# Altium footprint library ALL.PcbLib: 153 footprints (part 9 of 11)
Each footprint in its own frame and in the unit in brackets; x right, y up, seen from the top. Pads: shape width x height; smd on the part's side, far side on the other; paste and mask are expansions set on the pad; w line width, h text height; cw(c..) or ccw(c..) is an arc to the next point about the centre after c.
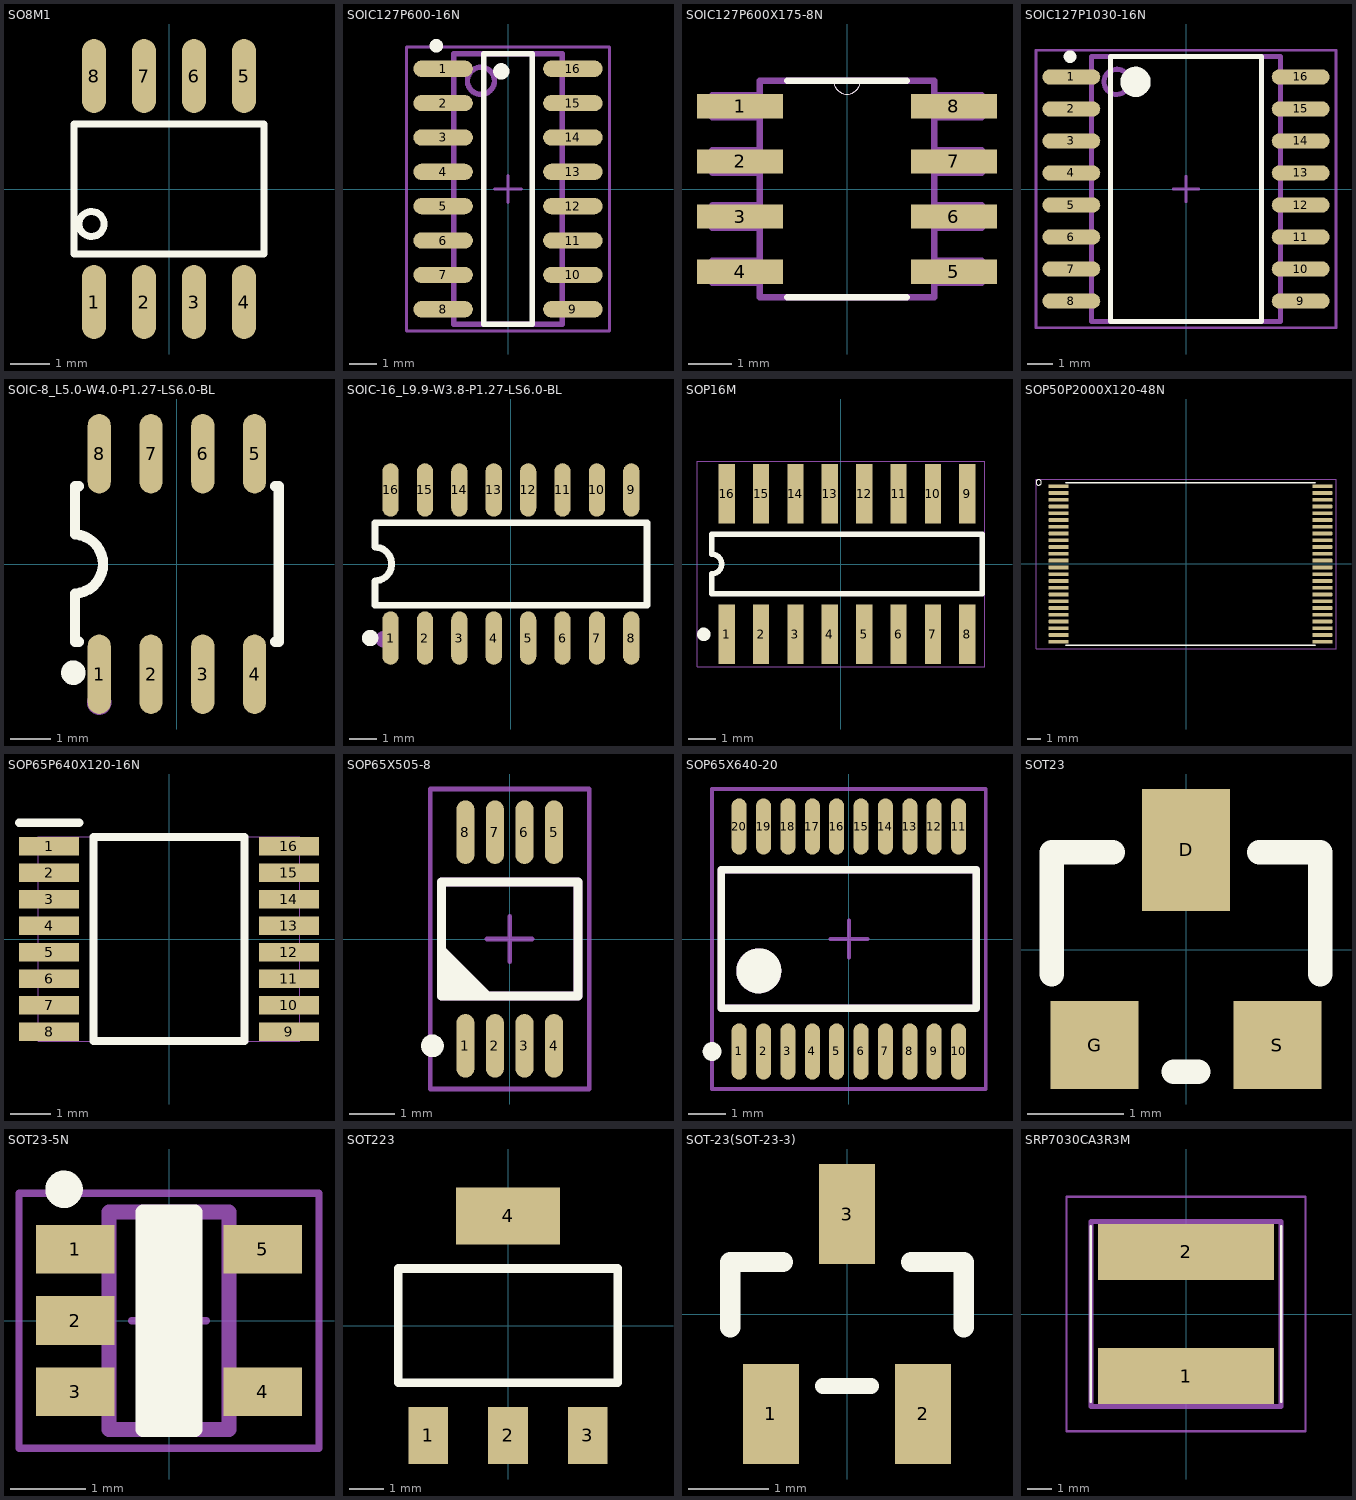
[diagram p8: the footprints below, top view; thin cyan lines are the x and y axes]

## SO8M1 [mil]
pads (8):
  oval 24x74 smd: 1(-75,-113) 2(-25,-113) 3(25,-113) 4(75,-113) 5(75,113) 6(25,113) 7(-25,113) 8(-75,113)
Top Overlay:
  circle w7: c-77.5,-35 r12.5
  lines w7: -95,-65 -95,65 95,65 95,-65 -95,-65

## SOIC127P600-16N [mm]
pads (16):
  oval 2.2x0.6 smd: 1(-2.4,4.445) 2(-2.4,3.175) 3(-2.4,1.905) 4(-2.4,0.635) 5(-2.4,-0.635) 6(-2.4,-1.905) 7(-2.4,-3.175) 8(-2.4,-4.445) 9(2.4,-4.445) 10(2.4,-3.175) 11(2.4,-1.905) 12(2.4,-0.635) 13(2.4,0.635) 14(2.4,1.905) 15(2.4,3.175) 16(2.4,4.445)
Top Overlay:
  circle w0.3: c-0.25,4.35 r0.15
  circle w0.25: c-2.65,5.295 r0.125
  lines w0.2: -0.9,-5 0.9,-5 0.9,5 -0.9,5 -0.9,-5
Mechanical 1:
  circle w0.2: c-1,4 r0.5
  lines w0.2: -2,-5 2,-5 2,5 -2,5 -2,-5
  text "U28" at 0.5,-1.45 h1
Mechanical 8:
  lines w0.1: -0.5,0 0.5,0 ; 0,-0.5 0,0.5 ; -3.75,-5.25 3.75,-5.25 3.75,5.25 -3.75,5.25 -3.75,-5.25
Mechanical 9:
  lines w0.001: -2,-5 2,-5 2,5 -2,5 -2,-5

## SOIC127P600X175-8N [mil]
pads (8):
  rect 78x22 smd: 1(-97,75) 2(-97,25) 3(-97,-25) 4(-97,-75) 5(97,-75) 6(97,-25) 7(97,25) 8(97,75)
Top Overlay:
  lines w0: -12,98 ccw(c0,98) 12,98
  lines w6: -54,-98 54,-98 ; -54,98 -12,98 12,98 54,98
Mechanical 13:
  lines w0: -12,98 ccw(c0,98) 12,98
  lines w6: -122,-85 -122,-65 -79,-65 -79,-85 -122,-85 ; -122,-35 -122,-15 -79,-15 -79,-35 -122,-35 ; -122,15 -122,35 -79,35 -79,15 -122,15 ; -122,65 -122,85 -79,85 -79,65 -122,65 ; -79,-98 79,-98 79,98 12,98 -12,98 -79,98 -79,-98 ; 79,-85 79,-65 122,-65 122,-85 79,-85 ; 79,-35 79,-15 122,-15 122,-35 79,-35 ; 79,15 79,35 122,35 122,15 79,15 ; 79,65 79,85 122,85 122,65 79,65
3D body "step_temp.STEP": height 68.9, standoff 0, extent -118.11,-96.46 118.11,96.46

## SOIC127P1030-16N [mm]
pads (16):
  oval 2.3x0.6 smd: 1(-4.55,4.445) 2(-4.55,3.175) 3(-4.55,1.905) 4(-4.55,0.635) 5(-4.55,-0.635) 6(-4.55,-1.905) 7(-4.55,-3.175) 8(-4.55,-4.445) 9(4.55,-4.445) 10(4.55,-3.175) 11(4.55,-1.905) 12(4.55,-0.635) 13(4.55,0.635) 14(4.55,1.905) 15(4.55,3.175) 16(4.55,4.445)
Top Overlay:
  circle w0.6: c-2,4.25 r0.3
  circle w0.25: c-4.6,5.25 r0.125
  lines w0.2: -3,-5.25 3,-5.25 3,5.25 -3,5.25 -3,-5.25
Mechanical 1:
  circle w0.2: c-2.75,4.25 r0.5
  lines w0.2: -3.75,-5.25 3.75,-5.25 3.75,5.25 -3.75,5.25 -3.75,-5.25
  text "U134" at -1.64,-0.5 h1
Mechanical 8:
  lines w0.1: -0.5,0 0.5,0 ; 0,-0.5 0,0.5 ; -5.95,-5.5 5.95,-5.5 5.95,5.5 -5.95,5.5 -5.95,-5.5
Mechanical 9:
  lines w0.001: -3.75,-5.25 3.75,-5.25 3.75,5.25 -3.75,5.25 -3.75,-5.25

## SOIC-8_L5.0-W4.0-P1.27-LS6.0-BL [mil]
pads (8):
  oval 22.38x76.78 smd: 1(-75,-106.5) 2(-25,-106.5) 3(25,-106.5) 4(75,-106.5) 5(75,106.5) 6(25,106.5) 7(-25,106.5) 8(-75,106.5)
Top Overlay:
  circle w11.81: c-100,-105 r5.91
  lines w10: -98.43,-28.61 ccw(c-99.99,0) -98.23,28.59 ; -98.42,-28.61 -98.42,-59.05 -98.42,-75 -94.83,-75 ; -98.42,28.59 -98.42,59.05 -98.42,75 -94.83,75 ; 94.83,-75 98.42,-75 98.42,-59.05 98.42,59.05 98.42,75 94.83,75
Mechanical 15:
  circle w11.81: c-75,-133.86 r5.91

## SOIC-16_L9.9-W3.8-P1.27-LS6.0-BL [mm]
pads (16):
  oval 0.602x1.971 smd: 1(-4.445,-2.736) 2(-3.175,-2.736) 3(-1.905,-2.736) 4(-0.635,-2.736) 5(0.635,-2.736) 6(1.905,-2.736) 7(3.175,-2.736) 8(4.445,-2.736) 9(4.445,2.736) 10(3.175,2.736) 11(1.905,2.736) 12(0.635,2.736) 13(-0.635,2.736) 14(-1.905,2.736) 15(-3.175,2.736) 16(-4.445,2.736)
Top Overlay:
  circle w0.3: c-5.198,-2.736 r0.15
  lines w0.254: -5.026,0.621 -5.026,1.521 5.026,1.521 5.026,-1.521 -5.026,-1.521 -5.026,-0.621 ccw(c-5.026,0.001) -5.026,0.623
Mechanical 15:
  circle w0.3: c-4.71,-2.78 r0.15

## SOP16M [mm] "SOP16M"
pads (16):
  rect 0.6x2.2 smd: 1(-4.222,-2.6) 2(-2.952,-2.6) 3(-1.682,-2.6) 4(-0.412,-2.6) 5(0.858,-2.6) 6(2.128,-2.6) 7(3.398,-2.6) 8(4.668,-2.6) 9(4.668,2.6) 10(3.398,2.6) 11(2.128,2.6) 12(0.858,2.6) 13(-0.412,2.6) 14(-1.682,2.6) 15(-2.952,2.6) 16(-4.222,2.6)
Top Overlay:
  circle w0.25: c-5.073,-2.6 r0.125
  lines w0.2: -4.777,-1.1 5.222,-1.1 5.222,1.1 -4.777,1.1 -4.777,0.367 cw(c-4.777,0) -4.777,-0.367 -4.777,-1.1
  text ".Designator" at -6.153,-0.61 h0.76
Mechanical 7:
  lines w0.025: -5.323,-3.802 -5.323,3.802 5.323,3.802 5.323,-3.802 -5.323,-3.802

## SOP50P2000X120-48N [mil] "SOP50P2000X120-48N"
pads (48):
  rrect25% 58.28x11.02 smd: 1(-370.38,226.37) 2(-370.38,206.69) 3(-370.38,187) 4(-370.38,167.32) 5(-370.38,147.63) 6(-370.38,127.95) 7(-370.38,108.26) 8(-370.38,88.58) 9(-370.38,68.89) 10(-370.38,49.21) 11(-370.38,29.52) 12(-370.38,9.84) 13(-370.38,-9.85) 14(-370.38,-29.53) 15(-370.38,-49.22) 16(-370.38,-68.9) 17(-370.38,-88.59) 18(-370.38,-108.27) 19(-370.38,-127.96) 20(-370.38,-147.64) 21(-370.38,-167.33) 22(-370.38,-187.01) 23(-370.38,-206.7) 24(-370.38,-226.38) 25(396.55,-226.38) 26(396.55,-206.7) 27(396.55,-187.01) 28(396.55,-167.33) 29(396.55,-147.64) 30(396.55,-127.96) 31(396.55,-108.27) 32(396.55,-88.59) 33(396.55,-68.9) 34(396.55,-49.22) 35(396.55,-29.53) 36(396.55,-9.85) 37(396.55,9.84) 38(396.55,29.52) 39(396.55,49.21) 40(396.55,68.89) 41(396.55,88.58) 42(396.55,108.26) 43(396.55,127.95) 44(396.55,147.63) 45(396.55,167.32) 46(396.55,187) 47(396.55,206.69) 48(396.55,226.37)
Top Overlay:
  circle w1: c-428.65,237.4 r7.87
  lines w5: -349.12,-236.22 375.29,-236.22 ; -349.12,236.22 375.29,236.22
Mechanical 7:
  lines w1: -436.52,-247.06 -436.52,247.05 436.51,247.05 436.51,-247.06 -436.52,-247.06
Mechanical 16:
  text ".Designator" at 13.08,0 h30

## SOP65P640X120-16N [mm] "SOP65P640X120-16N"
pads (16):
  rect 1.475x0.45 smd: 1(-2.938,2.275) 2(-2.938,1.625) 3(-2.938,0.975) 4(-2.938,0.325) 5(-2.938,-0.325) 6(-2.938,-0.975) 7(-2.938,-1.625) 8(-2.938,-2.275) 9(2.938,-2.275) 10(2.938,-1.625) 11(2.938,-0.975) 12(2.938,-0.325) 13(2.938,0.325) 14(2.938,0.975) 15(2.938,1.625) 16(2.938,2.275)
Top Overlay:
  lines w0.2: -3.675,2.85 -2.2,2.85 ; -1.85,-2.5 1.85,-2.5 1.85,2.5 -1.85,2.5 -1.85,-2.5
Mechanical 7:
  lines w0.025: -3.2,-2.5 3.2,-2.5 3.2,2.5 -3.2,2.5 -3.2,-2.5
Mechanical 16:
  text ".Designator" at 0,0 h0.76

## SOP65X505-8 [mm]
pads (8):
  oval 0.4x1.4 smd: 1(-0.975,-2.35) 2(-0.325,-2.35) 3(0.325,-2.35) 4(0.975,-2.35) 5(0.975,2.35) 6(0.325,2.35) 7(-0.325,2.35) 8(-0.975,2.35)
Top Overlay:
  circle w0.25: c-1.7,-2.35 r0.125
  lines w0.2: -1.5,-1 -1.25,-1.25 ; -1.5,-0.75 -1,-1.25 ; -1.5,-0.5 -0.75,-1.25 ; -1.5,-0.25 -0.5,-1.25 ; -1.5,-1.25 1.5,-1.25 1.5,1.25 -1.5,1.25 -1.5,-1.25
Mechanical 1:
  lines w0.2: -1.5,-1 -1.25,-1.25 ; -1.5,-0.75 -1,-1.25 ; -1.5,-0.5 -0.75,-1.25 ; -1.5,-0.25 -0.5,-1.25 ; -1.5,-1.25 1.5,-1.25 1.5,1.25 -1.5,1.25 -1.5,-1.25
  text "U45" at -0.912,0.05 h0.75
Mechanical 8:
  lines w0.1: -0.5,0 0.5,0 ; 0,-0.5 0,0.5 ; -1.75,-3.3 -1.75,3.3 1.75,3.3 1.75,-3.3 -1.75,-3.3

## SOP65X640-20 [mm]
pads (20):
  oval 0.4x1.5 smd: 1(-2.925,-3) 2(-2.275,-3) 3(-1.625,-3) 4(-0.975,-3) 5(-0.325,-3) 6(0.325,-3) 7(0.975,-3) 8(1.625,-3) 9(2.275,-3) 10(2.925,-3) 11(2.925,3) 12(2.275,3) 13(1.625,3) 14(0.975,3) 15(0.325,3) 16(-0.325,3) 17(-0.975,3) 18(-1.625,3) 19(-2.275,3) 20(-2.925,3)
Top Overlay:
  circle w0.25: c-3.65,-3 r0.125
  circle w0.6: c-2.4,-0.85 r0.3
  lines w0.2: -3.4,-1.85 3.4,-1.85 3.4,1.85 -3.4,1.85 -3.4,-1.85
Mechanical 1:
  circle w0.2: c-2.4,-0.85 r0.5
  lines w0.2: -3.4,-1.85 3.4,-1.85 3.4,1.85 -3.4,1.85 -3.4,-1.85
  text "U11" at -0.257,-0.5 h1
Mechanical 8:
  lines w0.1: -0.5,0 0.5,0 ; 0,-0.5 0,0.5 ; -3.65,-4 -3.65,4 3.65,4 3.65,-4 -3.65,-4

## SOT23 [mil]
pads (3):
  rect 36x50 smd: D(0,41)
  rect 36x36 smd: G(-37.5,-39) S(37.5,-39)
Top Overlay:
  lines w10: -55,-10 -55,40 -30,40 ; -5,-50 5,-50 ; 30,40 55,40 55,-10

## SOT23-5N [mm]
pads (5):
  rect 1.05x0.65 smd: 1(-1.25,0.95) 2(-1.25,0) 3(-1.25,-0.95) 4(1.25,-0.95) 5(1.25,0.95)
Top Overlay:
  circle w0.25: c-1.4,1.75 r0.125
  lines w0.2: -0.25,-1.45 -0.25,1.45 ; -0.1,-1.45 -0.1,1.45 ; 0.05,-1.45 0.05,1.45 ; 0.2,-1.45 0.2,1.45 ; -0.35,-1.45 0.35,-1.45 0.35,1.45 -0.35,1.45 -0.35,-1.45
Mechanical 1:
  lines w0.2: -0.8,-1.45 0.8,-1.45 0.8,1.45 -0.8,1.45 -0.8,-1.45
  text "U71" at -0.802,-0.35 h0.75
Mechanical 8:
  lines w0.1: -0.5,0 0.5,0 ; 0,-0.5 0,0.5 ; -2,-1.7 -2,1.7 2,1.7 2,-1.7 -2,-1.7
Mechanical 9:
  lines w0.001: -0.8,-1.45 0.8,-1.45 0.8,1.45 -0.8,1.45 -0.8,-1.45

## SOT223 [mil]
pads (4):
  rect 45x65 smd: 1(-91,-125) 2(0,-125) 3(91,-125)
  rect 118x65 smd: 4(0,125)
Top Overlay:
  lines w10: -125,-65 125,-65 125,65 -125,65 -125,-65

## SOT-23(SOT-23-3) [mm]
pads (3):
  rect 0.7x1.25 smd: 1(-0.95,-1.25) 2(0.95,-1.25) 3(0,1.25)
Top Overlay:
  lines w0.2: -0.3,-0.9 0.3,-0.9
  lines w0.254: -1.46,-0.165 -1.46,0.65 -0.8,0.65 ; 1.46,-0.165 1.46,0.65 ; 0.8,0.65 1.46,0.65 ; 0.8,0.65 1.46,0.65 ; 0.8,0.65 1.46,0.65

## SRP7030CA3R3M [mm]
height 1.25
pads (2):
  rect 7.2x2.3 smd: 1(0,-2.55) 2(0,2.55)
Top Overlay:
  lines w0.1: -3.9,-3.6 -3.9,3.6 ; 3.9,-3.6 3.9,3.6
Mechanical 13:
  lines w0.2: -3.9,-3.8 3.9,-3.8 3.9,3.8 -3.9,3.8 -3.9,-3.8
Mechanical 15:
  lines w0.1: -4.9,-4.8 4.9,-4.8 4.9,4.8 -4.9,4.8 -4.9,-4.8
3D body "SRP7030CA-3R3M.stp": height 3.02, standoff 0.03, extent -3.9,-3.8 3.9,3.8